# Altium schematic symbol library jlcpcb_2025_04_capacitors_extended_1206.schlib: 2503 symbols (part 8 of 14)
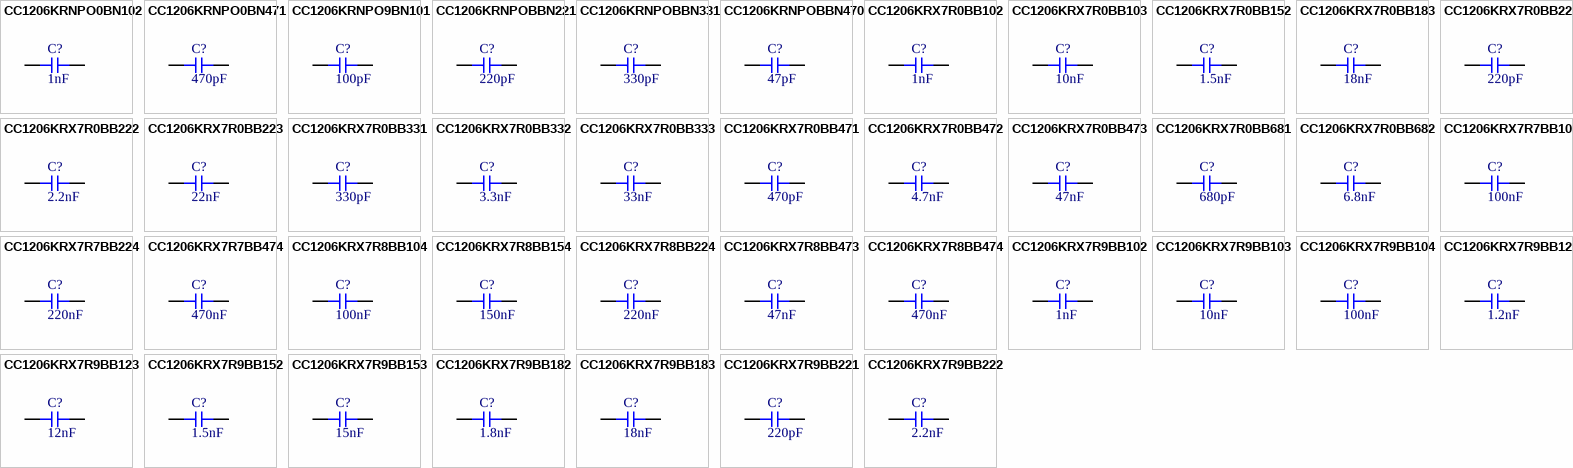
[diagram p69: symbols CC1206KRNPO0BN102 to CC1206KRX7R9BB222]

## CC1206KRNPO9BN101
designator C?  Capacitance: 100pF  (hidden comment: *)
Capacitor, Ceramic (MLCC), 100pF, ±10%, 50V, NP0, ±10%, SMD 1206; Manufacturer: YAGEO; Manufacturer Part Number: CC1206KRNPO9BN101; Package Size: 1206; JLCPCB Basic Part: No; JLCPCB Part Number: C1854299; Supplier 1: LCSC; Category: Capacitors - MLCC; Supplier Part Number 1: C1854299; Tolerance: ±10%; Voltage Rating: 50V; Temperature Coefficient: NP0; RoHS: Yes; ComponentLink1Description: Datasheet; ComponentLink1URL: https://wmsc.lcsc.com/wmsc/upload/file/pdf/v2/lcsc/2201271130_YAGEO-CC1206KRNPO9BN101_C1854299.pdf; ComponentLink2Description: JLCPCB Part URL; ComponentLink2URL: https://jlcpcb.com/partdetail/C1854299; ComponentLink3Description: LCSC Part URL; ComponentLink3URL: https://lcsc.com/product-detail/Multilayer-Ceramic-Capacitors-MLCC---SMD-SMT_YAGEO-YAGEO-CC1206KRNPO9BN101_C1854299.html
footprint CAP-1206 (1206 (3216M) Capacitor)
pins: 1, 2

## CC1206KRNPOBBN221
designator C?  Capacitance: 220pF  (hidden comment: *)
Capacitor, Ceramic (MLCC), 220pF, ±10%, 500V, NP0, ±10%, SMD 1206; Manufacturer: YAGEO; Manufacturer Part Number: CC1206KRNPOBBN221; Package Size: 1206; JLCPCB Basic Part: No; JLCPCB Part Number: C527341; Supplier 1: LCSC; Category: Capacitors - MLCC; Supplier Part Number 1: C527341; Tolerance: ±10%; Voltage Rating: 500V; Temperature Coefficient: NP0; RoHS: Yes; ComponentLink1Description: Datasheet; ComponentLink1URL: https://wmsc.lcsc.com/wmsc/upload/file/pdf/v2/lcsc/2007021837_YAGEO-CC1206KRNPOBBN221_C527341.pdf; ComponentLink2Description: JLCPCB Part URL; ComponentLink2URL: https://jlcpcb.com/partdetail/C527341; ComponentLink3Description: LCSC Part URL; ComponentLink3URL: https://lcsc.com/product-detail/Multilayer-Ceramic-Capacitors-MLCC---SMD-SMT_YAGEO-YAGEO-CC1206KRNPOBBN221_C527341.html
footprint CAP-1206 (1206 (3216M) Capacitor)
pins: 1, 2

## CC1206KRNPOBBN331
designator C?  Capacitance: 330pF  (hidden comment: *)
Capacitor, Ceramic (MLCC), 330pF, ±10%, 500V, NP0, ±10%, SMD 1206; Manufacturer: YAGEO; Manufacturer Part Number: CC1206KRNPOBBN331; Package Size: 1206; JLCPCB Basic Part: No; JLCPCB Part Number: C527342; Supplier 1: LCSC; Category: Capacitors - MLCC; Supplier Part Number 1: C527342; Tolerance: ±10%; Voltage Rating: 500V; Temperature Coefficient: NP0; RoHS: Yes; ComponentLink1Description: Datasheet; ComponentLink1URL: https://wmsc.lcsc.com/wmsc/upload/file/pdf/v2/lcsc/2007091835_YAGEO-CC1206KRNPOBBN331_C527342.pdf; ComponentLink2Description: JLCPCB Part URL; ComponentLink2URL: https://jlcpcb.com/partdetail/C527342; ComponentLink3Description: LCSC Part URL; ComponentLink3URL: https://lcsc.com/product-detail/Multilayer-Ceramic-Capacitors-MLCC---SMD-SMT_YAGEO-YAGEO-CC1206KRNPOBBN331_C527342.html
footprint CAP-1206 (1206 (3216M) Capacitor)
pins: 1, 2

## CC1206KRNPOBBN470
designator C?  Capacitance: 47pF  (hidden comment: *)
Capacitor, Ceramic (MLCC), 47pF, ±10%, 500V, NP0, ±10%, SMD 1206; Manufacturer: YAGEO; Manufacturer Part Number: CC1206KRNPOBBN470; Package Size: 1206; JLCPCB Basic Part: No; JLCPCB Part Number: C527343; Supplier 1: LCSC; Category: Capacitors - MLCC; Supplier Part Number 1: C527343; Tolerance: ±10%; Voltage Rating: 500V; Temperature Coefficient: NP0; RoHS: Yes; ComponentLink1Description: Datasheet; ComponentLink1URL: https://wmsc.lcsc.com/wmsc/upload/file/pdf/v2/lcsc/2006241835_YAGEO-CC1206KRNPOBBN470_C527343.pdf; ComponentLink2Description: JLCPCB Part URL; ComponentLink2URL: https://jlcpcb.com/partdetail/C527343; ComponentLink3Description: LCSC Part URL; ComponentLink3URL: https://lcsc.com/product-detail/Multilayer-Ceramic-Capacitors-MLCC---SMD-SMT_YAGEO-YAGEO-CC1206KRNPOBBN470_C527343.html
footprint CAP-1206 (1206 (3216M) Capacitor)
pins: 1, 2

## CC1206KRX7R0BB102
designator C?  Capacitance: 1nF  (hidden comment: *)
Capacitor, Ceramic (MLCC), 1nF, ±10%, 100V, X7R, ±10%, SMD 1206; Manufacturer: YAGEO; Manufacturer Part Number: CC1206KRX7R0BB102; Package Size: 1206; JLCPCB Basic Part: No; JLCPCB Part Number: C107203; Supplier 1: LCSC; Category: Capacitors - MLCC; Supplier Part Number 1: C107203; Tolerance: ±10%; Voltage Rating: 100V; Temperature Coefficient: X7R; RoHS: Yes; ComponentLink1Description: Datasheet; ComponentLink1URL: https://wmsc.lcsc.com/wmsc/upload/file/pdf/v2/lcsc/2304140030_YAGEO-CC1206KRX7R0BB102_C107203.pdf; ComponentLink2Description: JLCPCB Part URL; ComponentLink2URL: https://jlcpcb.com/partdetail/C107203; ComponentLink3Description: LCSC Part URL; ComponentLink3URL: https://lcsc.com/product-detail/Multilayer-Ceramic-Capacitors-MLCC---SMD-SMT_YAGEO-YAGEO-CC1206KRX7R0BB102_C107203.html
footprint CAP-1206 (1206 (3216M) Capacitor)
pins: 1, 2

## CC1206KRX7R0BB103
designator C?  Capacitance: 10nF  (hidden comment: *)
Capacitor, Ceramic (MLCC), 10nF, ±10%, 100V, X7R, ±10%, SMD 1206; Manufacturer: YAGEO; Manufacturer Part Number: CC1206KRX7R0BB103; Package Size: 1206; JLCPCB Basic Part: No; JLCPCB Part Number: C107204; Supplier 1: LCSC; Category: Capacitors - MLCC; Supplier Part Number 1: C107204; Tolerance: ±10%; Voltage Rating: 100V; Temperature Coefficient: X7R; RoHS: Yes; ComponentLink1Description: Datasheet; ComponentLink1URL: https://wmsc.lcsc.com/wmsc/upload/file/pdf/v2/lcsc/2304140030_YAGEO-CC1206KRX7R0BB103_C107204.pdf; ComponentLink2Description: JLCPCB Part URL; ComponentLink2URL: https://jlcpcb.com/partdetail/C107204; ComponentLink3Description: LCSC Part URL; ComponentLink3URL: https://lcsc.com/product-detail/Multilayer-Ceramic-Capacitors-MLCC---SMD-SMT_YAGEO-YAGEO-CC1206KRX7R0BB103_C107204.html
footprint CAP-1206 (1206 (3216M) Capacitor)
pins: 1, 2

## CC1206KRX7R0BB152
designator C?  Capacitance: 1.5nF  (hidden comment: *)
Capacitor, Ceramic (MLCC), 1.5nF, ±10%, 100V, X7R, ±10%, SMD 1206; Manufacturer: YAGEO; Manufacturer Part Number: CC1206KRX7R0BB152; Package Size: 1206; JLCPCB Basic Part: No; JLCPCB Part Number: C527344; Supplier 1: LCSC; Category: Capacitors - MLCC; Supplier Part Number 1: C527344; Tolerance: ±10%; Voltage Rating: 100V; Temperature Coefficient: X7R; RoHS: Yes; ComponentLink1Description: Datasheet; ComponentLink1URL: https://wmsc.lcsc.com/wmsc/upload/file/pdf/v2/lcsc/2005222143_YAGEO-CC1206KRX7R0BB152_C527344.pdf; ComponentLink2Description: JLCPCB Part URL; ComponentLink2URL: https://jlcpcb.com/partdetail/C527344; ComponentLink3Description: LCSC Part URL; ComponentLink3URL: https://lcsc.com/product-detail/Multilayer-Ceramic-Capacitors-MLCC---SMD-SMT_YAGEO-YAGEO-CC1206KRX7R0BB152_C527344.html
footprint CAP-1206 (1206 (3216M) Capacitor)
pins: 1, 2

## CC1206KRX7R0BB183
designator C?  Capacitance: 18nF  (hidden comment: *)
Capacitor, Ceramic (MLCC), 18nF, ±10%, 100V, X7R, ±10%, SMD 1206; Manufacturer: YAGEO; Manufacturer Part Number: CC1206KRX7R0BB183; Package Size: 1206; JLCPCB Basic Part: No; JLCPCB Part Number: C527345; Supplier 1: LCSC; Category: Capacitors - MLCC; Supplier Part Number 1: C527345; Tolerance: ±10%; Voltage Rating: 100V; Temperature Coefficient: X7R; RoHS: Yes; ComponentLink1Description: Datasheet; ComponentLink1URL: https://wmsc.lcsc.com/wmsc/upload/file/pdf/v2/lcsc/2007221234_YAGEO-CC1206KRX7R0BB183_C527345.pdf; ComponentLink2Description: JLCPCB Part URL; ComponentLink2URL: https://jlcpcb.com/partdetail/C527345; ComponentLink3Description: LCSC Part URL; ComponentLink3URL: https://lcsc.com/product-detail/Multilayer-Ceramic-Capacitors-MLCC---SMD-SMT_YAGEO-YAGEO-CC1206KRX7R0BB183_C527345.html
footprint CAP-1206 (1206 (3216M) Capacitor)
pins: 1, 2

## CC1206KRX7R0BB221
designator C?  Capacitance: 220pF  (hidden comment: *)
Capacitor, Ceramic (MLCC), 220pF, ±10%, 100V, X7R, ±10%, SMD 1206; Manufacturer: YAGEO; Manufacturer Part Number: CC1206KRX7R0BB221; Package Size: 1206; JLCPCB Basic Part: No; JLCPCB Part Number: C577231; Supplier 1: LCSC; Category: Capacitors - MLCC; Supplier Part Number 1: C577231; Tolerance: ±10%; Voltage Rating: 100V; Temperature Coefficient: X7R; RoHS: Yes; ComponentLink1Description: Datasheet; ComponentLink1URL: https://wmsc.lcsc.com/wmsc/upload/file/pdf/v2/lcsc/2201242200_YAGEO-CC1206KRX7R0BB221_C577231.pdf; ComponentLink2Description: JLCPCB Part URL; ComponentLink2URL: https://jlcpcb.com/partdetail/C577231; ComponentLink3Description: LCSC Part URL; ComponentLink3URL: https://lcsc.com/product-detail/Multilayer-Ceramic-Capacitors-MLCC---SMD-SMT_YAGEO-YAGEO-CC1206KRX7R0BB221_C577231.html
footprint CAP-1206 (1206 (3216M) Capacitor)
pins: 1, 2

## CC1206KRX7R0BB222
designator C?  Capacitance: 2.2nF  (hidden comment: *)
Capacitor, Ceramic (MLCC), 2.2nF, ±10%, 100V, X7R, ±10%, SMD 1206; Manufacturer: YAGEO; Manufacturer Part Number: CC1206KRX7R0BB222; Package Size: 1206; JLCPCB Basic Part: No; JLCPCB Part Number: C107205; Supplier 1: LCSC; Category: Capacitors - MLCC; Supplier Part Number 1: C107205; Tolerance: ±10%; Voltage Rating: 100V; Temperature Coefficient: X7R; RoHS: Yes; ComponentLink1Description: Datasheet; ComponentLink1URL: https://wmsc.lcsc.com/wmsc/upload/file/pdf/v2/lcsc/2304140030_YAGEO-CC1206KRX7R0BB222_C107205.pdf; ComponentLink2Description: JLCPCB Part URL; ComponentLink2URL: https://jlcpcb.com/partdetail/C107205; ComponentLink3Description: LCSC Part URL; ComponentLink3URL: https://lcsc.com/product-detail/Multilayer-Ceramic-Capacitors-MLCC---SMD-SMT_YAGEO-YAGEO-CC1206KRX7R0BB222_C107205.html
footprint CAP-1206 (1206 (3216M) Capacitor)
pins: 1, 2

## CC1206KRX7R0BB223
designator C?  Capacitance: 22nF  (hidden comment: *)
Capacitor, Ceramic (MLCC), 22nF, ±10%, 100V, X7R, ±10%, SMD 1206; Manufacturer: YAGEO; Manufacturer Part Number: CC1206KRX7R0BB223; Package Size: 1206; JLCPCB Basic Part: No; JLCPCB Part Number: C513671; Supplier 1: LCSC; Category: Capacitors - MLCC; Supplier Part Number 1: C513671; Tolerance: ±10%; Voltage Rating: 100V; Temperature Coefficient: X7R; RoHS: Yes; ComponentLink1Description: Datasheet; ComponentLink1URL: https://wmsc.lcsc.com/wmsc/upload/file/pdf/v2/lcsc/2005142208_YAGEO-CC1206KRX7R0BB223_C513671.pdf; ComponentLink2Description: JLCPCB Part URL; ComponentLink2URL: https://jlcpcb.com/partdetail/C513671; ComponentLink3Description: LCSC Part URL; ComponentLink3URL: https://lcsc.com/product-detail/Multilayer-Ceramic-Capacitors-MLCC---SMD-SMT_YAGEO-YAGEO-CC1206KRX7R0BB223_C513671.html
footprint CAP-1206 (1206 (3216M) Capacitor)
pins: 1, 2

## CC1206KRX7R0BB331
designator C?  Capacitance: 330pF  (hidden comment: *)
Capacitor, Ceramic (MLCC), 330pF, ±10%, 100V, X7R, ±10%, SMD 1206; Manufacturer: YAGEO; Manufacturer Part Number: CC1206KRX7R0BB331; Package Size: 1206; JLCPCB Basic Part: No; JLCPCB Part Number: C513609; Supplier 1: LCSC; Category: Capacitors - MLCC; Supplier Part Number 1: C513609; Tolerance: ±10%; Voltage Rating: 100V; Temperature Coefficient: X7R; RoHS: Yes; ComponentLink1Description: Datasheet; ComponentLink1URL: https://wmsc.lcsc.com/wmsc/upload/file/pdf/v2/lcsc/2005142148_YAGEO-CC1206KRX7R0BB331_C513609.pdf; ComponentLink2Description: JLCPCB Part URL; ComponentLink2URL: https://jlcpcb.com/partdetail/C513609; ComponentLink3Description: LCSC Part URL; ComponentLink3URL: https://lcsc.com/product-detail/Multilayer-Ceramic-Capacitors-MLCC---SMD-SMT_YAGEO-YAGEO-CC1206KRX7R0BB331_C513609.html
footprint CAP-1206 (1206 (3216M) Capacitor)
pins: 1, 2

## CC1206KRX7R0BB332
designator C?  Capacitance: 3.3nF  (hidden comment: *)
Capacitor, Ceramic (MLCC), 3.3nF, ±10%, 100V, X7R, ±10%, SMD 1206; Manufacturer: YAGEO; Manufacturer Part Number: CC1206KRX7R0BB332; Package Size: 1206; JLCPCB Basic Part: No; JLCPCB Part Number: C577233; Supplier 1: LCSC; Category: Capacitors - MLCC; Supplier Part Number 1: C577233; Tolerance: ±10%; Voltage Rating: 100V; Temperature Coefficient: X7R; RoHS: Yes; ComponentLink1Description: Datasheet; ComponentLink1URL: https://wmsc.lcsc.com/wmsc/upload/file/pdf/v2/lcsc/2201242200_YAGEO-CC1206KRX7R0BB332_C577233.pdf; ComponentLink2Description: JLCPCB Part URL; ComponentLink2URL: https://jlcpcb.com/partdetail/C577233; ComponentLink3Description: LCSC Part URL; ComponentLink3URL: https://lcsc.com/product-detail/Multilayer-Ceramic-Capacitors-MLCC---SMD-SMT_YAGEO-YAGEO-CC1206KRX7R0BB332_C577233.html
footprint CAP-1206 (1206 (3216M) Capacitor)
pins: 1, 2

## CC1206KRX7R0BB333
designator C?  Capacitance: 33nF  (hidden comment: *)
Capacitor, Ceramic (MLCC), 33nF, ±10%, 100V, X7R, ±10%, SMD 1206; Manufacturer: YAGEO; Manufacturer Part Number: CC1206KRX7R0BB333; Package Size: 1206; JLCPCB Basic Part: No; JLCPCB Part Number: C113901; Supplier 1: LCSC; Category: Capacitors - MLCC; Supplier Part Number 1: C113901; Tolerance: ±10%; Voltage Rating: 100V; Temperature Coefficient: X7R; RoHS: Yes; ComponentLink1Description: Datasheet; ComponentLink1URL: https://wmsc.lcsc.com/wmsc/upload/file/pdf/v2/lcsc/2304140030_YAGEO-CC1206KRX7R0BB333_C113901.pdf; ComponentLink2Description: JLCPCB Part URL; ComponentLink2URL: https://jlcpcb.com/partdetail/C113901; ComponentLink3Description: LCSC Part URL; ComponentLink3URL: https://lcsc.com/product-detail/Multilayer-Ceramic-Capacitors-MLCC---SMD-SMT_YAGEO-YAGEO-CC1206KRX7R0BB333_C113901.html
footprint CAP-1206 (1206 (3216M) Capacitor)
pins: 1, 2

## CC1206KRX7R0BB471
designator C?  Capacitance: 470pF  (hidden comment: *)
Capacitor, Ceramic (MLCC), 470pF, ±10%, 100V, X7R, ±10%, SMD 1206; Manufacturer: YAGEO; Manufacturer Part Number: CC1206KRX7R0BB471; Package Size: 1206; JLCPCB Basic Part: No; JLCPCB Part Number: C326698; Supplier 1: LCSC; Category: Capacitors - MLCC; Supplier Part Number 1: C326698; Tolerance: ±10%; Voltage Rating: 100V; Temperature Coefficient: X7R; RoHS: Yes; ComponentLink1Description: Datasheet; ComponentLink1URL: https://wmsc.lcsc.com/wmsc/upload/file/pdf/v2/lcsc/1811151646_YAGEO-CC1206KRX7R0BB471_C326698.pdf; ComponentLink2Description: JLCPCB Part URL; ComponentLink2URL: https://jlcpcb.com/partdetail/C326698; ComponentLink3Description: LCSC Part URL; ComponentLink3URL: https://lcsc.com/product-detail/Multilayer-Ceramic-Capacitors-MLCC---SMD-SMT_YAGEO-YAGEO-CC1206KRX7R0BB471_C326698.html
footprint CAP-1206 (1206 (3216M) Capacitor)
pins: 1, 2

## CC1206KRX7R0BB472
designator C?  Capacitance: 4.7nF  (hidden comment: *)
Capacitor, Ceramic (MLCC), 4.7nF, ±10%, 100V, X7R, ±10%, SMD 1206; Manufacturer: YAGEO; Manufacturer Part Number: CC1206KRX7R0BB472; Package Size: 1206; JLCPCB Basic Part: No; JLCPCB Part Number: C577234; Supplier 1: LCSC; Category: Capacitors - MLCC; Supplier Part Number 1: C577234; Tolerance: ±10%; Voltage Rating: 100V; Temperature Coefficient: X7R; RoHS: Yes; ComponentLink1Description: Datasheet; ComponentLink1URL: https://wmsc.lcsc.com/wmsc/upload/file/pdf/v2/lcsc/2304140030_YAGEO-CC1206KRX7R0BB472_C577234.pdf; ComponentLink2Description: JLCPCB Part URL; ComponentLink2URL: https://jlcpcb.com/partdetail/C577234; ComponentLink3Description: LCSC Part URL; ComponentLink3URL: https://lcsc.com/product-detail/Multilayer-Ceramic-Capacitors-MLCC---SMD-SMT_YAGEO-YAGEO-CC1206KRX7R0BB472_C577234.html
footprint CAP-1206 (1206 (3216M) Capacitor)
pins: 1, 2

## CC1206KRX7R0BB473
designator C?  Capacitance: 47nF  (hidden comment: *)
Capacitor, Ceramic (MLCC), 47nF, ±10%, 100V, X7R, ±10%, SMD 1206; Manufacturer: YAGEO; Manufacturer Part Number: CC1206KRX7R0BB473; Package Size: 1206; JLCPCB Basic Part: No; JLCPCB Part Number: C107206; Supplier 1: LCSC; Category: Capacitors - MLCC; Supplier Part Number 1: C107206; Tolerance: ±10%; Voltage Rating: 100V; Temperature Coefficient: X7R; RoHS: Yes; ComponentLink1Description: Datasheet; ComponentLink1URL: https://wmsc.lcsc.com/wmsc/upload/file/pdf/v2/lcsc/2304140030_YAGEO-CC1206KRX7R0BB473_C107206.pdf; ComponentLink2Description: JLCPCB Part URL; ComponentLink2URL: https://jlcpcb.com/partdetail/C107206; ComponentLink3Description: LCSC Part URL; ComponentLink3URL: https://lcsc.com/product-detail/Multilayer-Ceramic-Capacitors-MLCC---SMD-SMT_YAGEO-YAGEO-CC1206KRX7R0BB473_C107206.html
footprint CAP-1206 (1206 (3216M) Capacitor)
pins: 1, 2

## CC1206KRX7R0BB681
designator C?  Capacitance: 680pF  (hidden comment: *)
Capacitor, Ceramic (MLCC), 680pF, ±10%, 100V, X7R, ±10%, SMD 1206; Manufacturer: YAGEO; Manufacturer Part Number: CC1206KRX7R0BB681; Package Size: 1206; JLCPCB Basic Part: No; JLCPCB Part Number: C327055; Supplier 1: LCSC; Category: Capacitors - MLCC; Supplier Part Number 1: C327055; Tolerance: ±10%; Voltage Rating: 100V; Temperature Coefficient: X7R; RoHS: Yes; ComponentLink1Description: Datasheet; ComponentLink1URL: https://wmsc.lcsc.com/wmsc/upload/file/pdf/v2/lcsc/1811141226_YAGEO-CC1206KRX7R0BB681_C327055.pdf; ComponentLink2Description: JLCPCB Part URL; ComponentLink2URL: https://jlcpcb.com/partdetail/C327055; ComponentLink3Description: LCSC Part URL; ComponentLink3URL: https://lcsc.com/product-detail/Multilayer-Ceramic-Capacitors-MLCC---SMD-SMT_YAGEO-YAGEO-CC1206KRX7R0BB681_C327055.html
footprint CAP-1206 (1206 (3216M) Capacitor)
pins: 1, 2

## CC1206KRX7R0BB682
designator C?  Capacitance: 6.8nF  (hidden comment: *)
Capacitor, Ceramic (MLCC), 6.8nF, ±10%, 100V, X7R, ±10%, SMD 1206; Manufacturer: YAGEO; Manufacturer Part Number: CC1206KRX7R0BB682; Package Size: 1206; JLCPCB Basic Part: No; JLCPCB Part Number: C577236; Supplier 1: LCSC; Category: Capacitors - MLCC; Supplier Part Number 1: C577236; Tolerance: ±10%; Voltage Rating: 100V; Temperature Coefficient: X7R; RoHS: Yes; ComponentLink1Description: Datasheet; ComponentLink1URL: https://wmsc.lcsc.com/wmsc/upload/file/pdf/v2/lcsc/2304140030_YAGEO-CC1206KRX7R0BB682_C577236.pdf; ComponentLink2Description: JLCPCB Part URL; ComponentLink2URL: https://jlcpcb.com/partdetail/C577236; ComponentLink3Description: LCSC Part URL; ComponentLink3URL: https://lcsc.com/product-detail/Multilayer-Ceramic-Capacitors-MLCC---SMD-SMT_YAGEO-YAGEO-CC1206KRX7R0BB682_C577236.html
footprint CAP-1206 (1206 (3216M) Capacitor)
pins: 1, 2

## CC1206KRX7R7BB104
designator C?  Capacitance: 100nF  (hidden comment: *)
Capacitor, Ceramic (MLCC), 100nF, ±10%, 16V, X7R, ±10%, SMD 1206; Manufacturer: YAGEO; Manufacturer Part Number: CC1206KRX7R7BB104; Package Size: 1206; JLCPCB Basic Part: No; JLCPCB Part Number: C2180991; Supplier 1: LCSC; Category: Capacitors - MLCC; Supplier Part Number 1: C2180991; Tolerance: ±10%; Voltage Rating: 16V; Temperature Coefficient: X7R; RoHS: Yes; ComponentLink1Description: Datasheet; ComponentLink1URL: https://wmsc.lcsc.com/wmsc/upload/file/pdf/v2/lcsc/2202041200_YAGEO-CC1206KRX7R7BB104_C2180991.pdf; ComponentLink2Description: JLCPCB Part URL; ComponentLink2URL: https://jlcpcb.com/partdetail/C2180991; ComponentLink3Description: LCSC Part URL; ComponentLink3URL: https://lcsc.com/product-detail/Multilayer-Ceramic-Capacitors-MLCC---SMD-SMT_YAGEO-YAGEO-CC1206KRX7R7BB104_C2180991.html
footprint CAP-1206 (1206 (3216M) Capacitor)
pins: 1, 2

## CC1206KRX7R7BB224
designator C?  Capacitance: 220nF  (hidden comment: *)
Capacitor, Ceramic (MLCC), 220nF, ±10%, 16V, X7R, ±10%, SMD 1206; Manufacturer: YAGEO; Manufacturer Part Number: CC1206KRX7R7BB224; Package Size: 1206; JLCPCB Basic Part: No; JLCPCB Part Number: C113903; Supplier 1: LCSC; Category: Capacitors - MLCC; Supplier Part Number 1: C113903; Tolerance: ±10%; Voltage Rating: 16V; Temperature Coefficient: X7R; RoHS: Yes; ComponentLink1Description: Datasheet; ComponentLink1URL: https://wmsc.lcsc.com/wmsc/upload/file/pdf/v2/lcsc/2304140030_YAGEO-CC1206KRX7R7BB224_C113903.pdf; ComponentLink2Description: JLCPCB Part URL; ComponentLink2URL: https://jlcpcb.com/partdetail/C113903; ComponentLink3Description: LCSC Part URL; ComponentLink3URL: https://lcsc.com/product-detail/Multilayer-Ceramic-Capacitors-MLCC---SMD-SMT_YAGEO-YAGEO-CC1206KRX7R7BB224_C113903.html
footprint CAP-1206 (1206 (3216M) Capacitor)
pins: 1, 2

## CC1206KRX7R7BB474
designator C?  Capacitance: 470nF  (hidden comment: *)
Capacitor, Ceramic (MLCC), 470nF, ±10%, 16V, X7R, ±10%, SMD 1206; Manufacturer: YAGEO; Manufacturer Part Number: CC1206KRX7R7BB474; Package Size: 1206; JLCPCB Basic Part: No; JLCPCB Part Number: C527346; Supplier 1: LCSC; Category: Capacitors - MLCC; Supplier Part Number 1: C527346; Tolerance: ±10%; Voltage Rating: 16V; Temperature Coefficient: X7R; RoHS: Yes; ComponentLink1Description: Datasheet; ComponentLink1URL: https://wmsc.lcsc.com/wmsc/upload/file/pdf/v2/lcsc/2006031836_YAGEO-CC1206KRX7R7BB474_C527346.pdf; ComponentLink2Description: JLCPCB Part URL; ComponentLink2URL: https://jlcpcb.com/partdetail/C527346; ComponentLink3Description: LCSC Part URL; ComponentLink3URL: https://lcsc.com/product-detail/Multilayer-Ceramic-Capacitors-MLCC---SMD-SMT_YAGEO-YAGEO-CC1206KRX7R7BB474_C527346.html
footprint CAP-1206 (1206 (3216M) Capacitor)
pins: 1, 2

## CC1206KRX7R8BB104
designator C?  Capacitance: 100nF  (hidden comment: *)
Capacitor, Ceramic (MLCC), 100nF, ±10%, 25V, X7R, ±10%, SMD 1206; Manufacturer: YAGEO; Manufacturer Part Number: CC1206KRX7R8BB104; Package Size: 1206; JLCPCB Basic Part: No; JLCPCB Part Number: C527347; Supplier 1: LCSC; Category: Capacitors - MLCC; Supplier Part Number 1: C527347; Tolerance: ±10%; Voltage Rating: 25V; Temperature Coefficient: X7R; RoHS: Yes; ComponentLink1Description: Datasheet; ComponentLink1URL: https://wmsc.lcsc.com/wmsc/upload/file/pdf/v2/lcsc/2005261833_YAGEO-CC1206KRX7R8BB104_C527347.pdf; ComponentLink2Description: JLCPCB Part URL; ComponentLink2URL: https://jlcpcb.com/partdetail/C527347; ComponentLink3Description: LCSC Part URL; ComponentLink3URL: https://lcsc.com/product-detail/Multilayer-Ceramic-Capacitors-MLCC---SMD-SMT_YAGEO-YAGEO-CC1206KRX7R8BB104_C527347.html
footprint CAP-1206 (1206 (3216M) Capacitor)
pins: 1, 2

## CC1206KRX7R8BB154
designator C?  Capacitance: 150nF  (hidden comment: *)
Capacitor, Ceramic (MLCC), 150nF, ±10%, 25V, X7R, ±10%, SMD 1206; Manufacturer: YAGEO; Manufacturer Part Number: CC1206KRX7R8BB154; Package Size: 1206; JLCPCB Basic Part: No; JLCPCB Part Number: C577239; Supplier 1: LCSC; Category: Capacitors - MLCC; Supplier Part Number 1: C577239; Tolerance: ±10%; Voltage Rating: 25V; Temperature Coefficient: X7R; RoHS: Yes; ComponentLink1Description: Datasheet; ComponentLink1URL: https://wmsc.lcsc.com/wmsc/upload/file/pdf/v2/lcsc/2311211121_YAGEO-CC1206KRX7R8BB154_C577239.pdf; ComponentLink2Description: JLCPCB Part URL; ComponentLink2URL: https://jlcpcb.com/partdetail/C577239; ComponentLink3Description: LCSC Part URL; ComponentLink3URL: https://lcsc.com/product-detail/Multilayer-Ceramic-Capacitors-MLCC---SMD-SMT_YAGEO-YAGEO-CC1206KRX7R8BB154_C577239.html
footprint CAP-1206 (1206 (3216M) Capacitor)
pins: 1, 2

## CC1206KRX7R8BB224
designator C?  Capacitance: 220nF  (hidden comment: *)
Capacitor, Ceramic (MLCC), 220nF, ±10%, 25V, X7R, ±10%, SMD 1206; Manufacturer: YAGEO; Manufacturer Part Number: CC1206KRX7R8BB224; Package Size: 1206; JLCPCB Basic Part: No; JLCPCB Part Number: C527348; Supplier 1: LCSC; Category: Capacitors - MLCC; Supplier Part Number 1: C527348; Tolerance: ±10%; Voltage Rating: 25V; Temperature Coefficient: X7R; RoHS: Yes; ComponentLink1Description: Datasheet; ComponentLink1URL: https://wmsc.lcsc.com/wmsc/upload/file/pdf/v2/lcsc/2005222143_YAGEO-CC1206KRX7R8BB224_C527348.pdf; ComponentLink2Description: JLCPCB Part URL; ComponentLink2URL: https://jlcpcb.com/partdetail/C527348; ComponentLink3Description: LCSC Part URL; ComponentLink3URL: https://lcsc.com/product-detail/Multilayer-Ceramic-Capacitors-MLCC---SMD-SMT_YAGEO-YAGEO-CC1206KRX7R8BB224_C527348.html
footprint CAP-1206 (1206 (3216M) Capacitor)
pins: 1, 2

## CC1206KRX7R8BB473
designator C?  Capacitance: 47nF  (hidden comment: *)
Capacitor, Ceramic (MLCC), 47nF, ±10%, 25V, X7R, ±10%, SMD 1206; Manufacturer: YAGEO; Manufacturer Part Number: CC1206KRX7R8BB473; Package Size: 1206; JLCPCB Basic Part: No; JLCPCB Part Number: C527349; Supplier 1: LCSC; Category: Capacitors - MLCC; Supplier Part Number 1: C527349; Tolerance: ±10%; Voltage Rating: 25V; Temperature Coefficient: X7R; RoHS: Yes; ComponentLink1Description: Datasheet; ComponentLink1URL: https://wmsc.lcsc.com/wmsc/upload/file/pdf/v2/lcsc/2006101835_YAGEO-CC1206KRX7R8BB473_C527349.pdf; ComponentLink2Description: JLCPCB Part URL; ComponentLink2URL: https://jlcpcb.com/partdetail/C527349; ComponentLink3Description: LCSC Part URL; ComponentLink3URL: https://lcsc.com/product-detail/Multilayer-Ceramic-Capacitors-MLCC---SMD-SMT_YAGEO-YAGEO-CC1206KRX7R8BB473_C527349.html
footprint CAP-1206 (1206 (3216M) Capacitor)
pins: 1, 2

## CC1206KRX7R8BB474
designator C?  Capacitance: 470nF  (hidden comment: *)
Capacitor, Ceramic (MLCC), 470nF, ±10%, 25V, X7R, ±10%, SMD 1206; Manufacturer: YAGEO; Manufacturer Part Number: CC1206KRX7R8BB474; Package Size: 1206; JLCPCB Basic Part: No; JLCPCB Part Number: C527350; Supplier 1: LCSC; Category: Capacitors - MLCC; Supplier Part Number 1: C527350; Tolerance: ±10%; Voltage Rating: 25V; Temperature Coefficient: X7R; RoHS: Yes; ComponentLink1Description: Datasheet; ComponentLink1URL: https://wmsc.lcsc.com/wmsc/upload/file/pdf/v2/lcsc/2006031836_YAGEO-CC1206KRX7R8BB474_C527350.pdf; ComponentLink2Description: JLCPCB Part URL; ComponentLink2URL: https://jlcpcb.com/partdetail/C527350; ComponentLink3Description: LCSC Part URL; ComponentLink3URL: https://lcsc.com/product-detail/Multilayer-Ceramic-Capacitors-MLCC---SMD-SMT_YAGEO-YAGEO-CC1206KRX7R8BB474_C527350.html
footprint CAP-1206 (1206 (3216M) Capacitor)
pins: 1, 2

## CC1206KRX7R9BB102
designator C?  Capacitance: 1nF  (hidden comment: *)
Capacitor, Ceramic (MLCC), 1nF, ±10%, 50V, X7R, ±10%, SMD 1206; Manufacturer: YAGEO; Manufacturer Part Number: CC1206KRX7R9BB102; Package Size: 1206; JLCPCB Basic Part: No; JLCPCB Part Number: C107207; Supplier 1: LCSC; Category: Capacitors - MLCC; Supplier Part Number 1: C107207; Tolerance: ±10%; Voltage Rating: 50V; Temperature Coefficient: X7R; RoHS: Yes; ComponentLink1Description: Datasheet; ComponentLink1URL: https://wmsc.lcsc.com/wmsc/upload/file/pdf/v2/lcsc/2304140030_YAGEO-CC1206KRX7R9BB102_C107207.pdf; ComponentLink2Description: JLCPCB Part URL; ComponentLink2URL: https://jlcpcb.com/partdetail/C107207; ComponentLink3Description: LCSC Part URL; ComponentLink3URL: https://lcsc.com/product-detail/Multilayer-Ceramic-Capacitors-MLCC---SMD-SMT_YAGEO-YAGEO-CC1206KRX7R9BB102_C107207.html
footprint CAP-1206 (1206 (3216M) Capacitor)
pins: 1, 2

## CC1206KRX7R9BB103
designator C?  Capacitance: 10nF  (hidden comment: *)
Capacitor, Ceramic (MLCC), 10nF, ±10%, 50V, X7R, ±10%, SMD 1206; Manufacturer: YAGEO; Manufacturer Part Number: CC1206KRX7R9BB103; Package Size: 1206; JLCPCB Basic Part: No; JLCPCB Part Number: C106239; Supplier 1: LCSC; Category: Capacitors - MLCC; Supplier Part Number 1: C106239; Tolerance: ±10%; Voltage Rating: 50V; Temperature Coefficient: X7R; RoHS: Yes; ComponentLink1Description: Datasheet; ComponentLink1URL: https://wmsc.lcsc.com/wmsc/upload/file/pdf/v2/lcsc/2304140030_YAGEO-CC1206KRX7R9BB103_C106239.pdf; ComponentLink2Description: JLCPCB Part URL; ComponentLink2URL: https://jlcpcb.com/partdetail/C106239; ComponentLink3Description: LCSC Part URL; ComponentLink3URL: https://lcsc.com/product-detail/Multilayer-Ceramic-Capacitors-MLCC---SMD-SMT_YAGEO-YAGEO-CC1206KRX7R9BB103_C106239.html
footprint CAP-1206 (1206 (3216M) Capacitor)
pins: 1, 2

## CC1206KRX7R9BB104
designator C?  Capacitance: 100nF  (hidden comment: *)
Capacitor, Ceramic (MLCC), 100nF, ±10%, 50V, X7R, ±10%, SMD 1206; Manufacturer: YAGEO; Manufacturer Part Number: CC1206KRX7R9BB104; Package Size: 1206; JLCPCB Basic Part: No; JLCPCB Part Number: C82601; Supplier 1: LCSC; Category: Capacitors - MLCC; Supplier Part Number 1: C82601; Tolerance: ±10%; Voltage Rating: 50V; Temperature Coefficient: X7R; RoHS: Yes; ComponentLink1Description: Datasheet; ComponentLink1URL: https://wmsc.lcsc.com/wmsc/upload/file/pdf/v2/lcsc/2304140030_YAGEO-CC1206KRX7R9BB104_C82601.pdf; ComponentLink2Description: JLCPCB Part URL; ComponentLink2URL: https://jlcpcb.com/partdetail/C82601; ComponentLink3Description: LCSC Part URL; ComponentLink3URL: https://lcsc.com/product-detail/Multilayer-Ceramic-Capacitors-MLCC---SMD-SMT_YAGEO-YAGEO-CC1206KRX7R9BB104_C82601.html
footprint CAP-1206 (1206 (3216M) Capacitor)
pins: 1, 2

## CC1206KRX7R9BB122
designator C?  Capacitance: 1.2nF  (hidden comment: *)
Capacitor, Ceramic (MLCC), 1.2nF, ±10%, 50V, X7R, ±10%, SMD 1206; Manufacturer: YAGEO; Manufacturer Part Number: CC1206KRX7R9BB122; Package Size: 1206; JLCPCB Basic Part: No; JLCPCB Part Number: C327095; Supplier 1: LCSC; Category: Capacitors - MLCC; Supplier Part Number 1: C327095; Tolerance: ±10%; Voltage Rating: 50V; Temperature Coefficient: X7R; RoHS: Yes; ComponentLink1Description: Datasheet; ComponentLink1URL: https://wmsc.lcsc.com/wmsc/upload/file/pdf/v2/lcsc/1811141233_YAGEO-CC1206KRX7R9BB122_C327095.pdf; ComponentLink2Description: JLCPCB Part URL; ComponentLink2URL: https://jlcpcb.com/partdetail/C327095; ComponentLink3Description: LCSC Part URL; ComponentLink3URL: https://lcsc.com/product-detail/Multilayer-Ceramic-Capacitors-MLCC---SMD-SMT_YAGEO-YAGEO-CC1206KRX7R9BB122_C327095.html
footprint CAP-1206 (1206 (3216M) Capacitor)
pins: 1, 2

## CC1206KRX7R9BB123
designator C?  Capacitance: 12nF  (hidden comment: *)
Capacitor, Ceramic (MLCC), 12nF, ±10%, 50V, X7R, ±10%, SMD 1206; Manufacturer: YAGEO; Manufacturer Part Number: CC1206KRX7R9BB123; Package Size: 1206; JLCPCB Basic Part: No; JLCPCB Part Number: C541488; Supplier 1: LCSC; Category: Capacitors - MLCC; Supplier Part Number 1: C541488; Tolerance: ±10%; Voltage Rating: 50V; Temperature Coefficient: X7R; RoHS: Yes; ComponentLink1Description: Datasheet; ComponentLink1URL: https://wmsc.lcsc.com/wmsc/upload/file/pdf/v2/lcsc/2006151140_YAGEO-CC1206KRX7R9BB123_C541488.pdf; ComponentLink2Description: JLCPCB Part URL; ComponentLink2URL: https://jlcpcb.com/partdetail/C541488; ComponentLink3Description: LCSC Part URL; ComponentLink3URL: https://lcsc.com/product-detail/Multilayer-Ceramic-Capacitors-MLCC---SMD-SMT_YAGEO-YAGEO-CC1206KRX7R9BB123_C541488.html
footprint CAP-1206 (1206 (3216M) Capacitor)
pins: 1, 2

## CC1206KRX7R9BB152
designator C?  Capacitance: 1.5nF  (hidden comment: *)
Capacitor, Ceramic (MLCC), 1.5nF, ±10%, 50V, X7R, ±10%, SMD 1206; Manufacturer: YAGEO; Manufacturer Part Number: CC1206KRX7R9BB152; Package Size: 1206; JLCPCB Basic Part: No; JLCPCB Part Number: C113904; Supplier 1: LCSC; Category: Capacitors - MLCC; Supplier Part Number 1: C113904; Tolerance: ±10%; Voltage Rating: 50V; Temperature Coefficient: X7R; RoHS: Yes; ComponentLink1Description: Datasheet; ComponentLink1URL: https://wmsc.lcsc.com/wmsc/upload/file/pdf/v2/lcsc/2304140030_YAGEO-CC1206KRX7R9BB152_C113904.pdf; ComponentLink2Description: JLCPCB Part URL; ComponentLink2URL: https://jlcpcb.com/partdetail/C113904; ComponentLink3Description: LCSC Part URL; ComponentLink3URL: https://lcsc.com/product-detail/Multilayer-Ceramic-Capacitors-MLCC---SMD-SMT_YAGEO-YAGEO-CC1206KRX7R9BB152_C113904.html
footprint CAP-1206 (1206 (3216M) Capacitor)
pins: 1, 2

## CC1206KRX7R9BB153
designator C?  Capacitance: 15nF  (hidden comment: *)
Capacitor, Ceramic (MLCC), 15nF, ±10%, 50V, X7R, ±10%, SMD 1206; Manufacturer: YAGEO; Manufacturer Part Number: CC1206KRX7R9BB153; Package Size: 1206; JLCPCB Basic Part: No; JLCPCB Part Number: C309503; Supplier 1: LCSC; Category: Capacitors - MLCC; Supplier Part Number 1: C309503; Tolerance: ±10%; Voltage Rating: 50V; Temperature Coefficient: X7R; RoHS: Yes; ComponentLink1Description: Datasheet; ComponentLink1URL: https://wmsc.lcsc.com/wmsc/upload/file/pdf/v2/lcsc/2304140030_YAGEO-CC1206KRX7R9BB153_C309503.pdf; ComponentLink2Description: JLCPCB Part URL; ComponentLink2URL: https://jlcpcb.com/partdetail/C309503; ComponentLink3Description: LCSC Part URL; ComponentLink3URL: https://lcsc.com/product-detail/Multilayer-Ceramic-Capacitors-MLCC---SMD-SMT_YAGEO-YAGEO-CC1206KRX7R9BB153_C309503.html
footprint CAP-1206 (1206 (3216M) Capacitor)
pins: 1, 2

## CC1206KRX7R9BB182
designator C?  Capacitance: 1.8nF  (hidden comment: *)
Capacitor, Ceramic (MLCC), 1.8nF, ±10%, 50V, X7R, ±10%, SMD 1206; Manufacturer: YAGEO; Manufacturer Part Number: CC1206KRX7R9BB182; Package Size: 1206; JLCPCB Basic Part: No; JLCPCB Part Number: C527351; Supplier 1: LCSC; Category: Capacitors - MLCC; Supplier Part Number 1: C527351; Tolerance: ±10%; Voltage Rating: 50V; Temperature Coefficient: X7R; RoHS: Yes; ComponentLink1Description: Datasheet; ComponentLink1URL: https://wmsc.lcsc.com/wmsc/upload/file/pdf/v2/lcsc/2006101835_YAGEO-CC1206KRX7R9BB182_C527351.pdf; ComponentLink2Description: JLCPCB Part URL; ComponentLink2URL: https://jlcpcb.com/partdetail/C527351; ComponentLink3Description: LCSC Part URL; ComponentLink3URL: https://lcsc.com/product-detail/Multilayer-Ceramic-Capacitors-MLCC---SMD-SMT_YAGEO-YAGEO-CC1206KRX7R9BB182_C527351.html
footprint CAP-1206 (1206 (3216M) Capacitor)
pins: 1, 2

## CC1206KRX7R9BB183
designator C?  Capacitance: 18nF  (hidden comment: *)
Capacitor, Ceramic (MLCC), 18nF, ±10%, 50V, X7R, ±10%, SMD 1206; Manufacturer: YAGEO; Manufacturer Part Number: CC1206KRX7R9BB183; Package Size: 1206; JLCPCB Basic Part: No; JLCPCB Part Number: C527352; Supplier 1: LCSC; Category: Capacitors - MLCC; Supplier Part Number 1: C527352; Tolerance: ±10%; Voltage Rating: 50V; Temperature Coefficient: X7R; RoHS: Yes; ComponentLink1Description: Datasheet; ComponentLink1URL: https://wmsc.lcsc.com/wmsc/upload/file/pdf/v2/lcsc/2005222143_YAGEO-CC1206KRX7R9BB183_C527352.pdf; ComponentLink2Description: JLCPCB Part URL; ComponentLink2URL: https://jlcpcb.com/partdetail/C527352; ComponentLink3Description: LCSC Part URL; ComponentLink3URL: https://lcsc.com/product-detail/Multilayer-Ceramic-Capacitors-MLCC---SMD-SMT_YAGEO-YAGEO-CC1206KRX7R9BB183_C527352.html
footprint CAP-1206 (1206 (3216M) Capacitor)
pins: 1, 2

## CC1206KRX7R9BB221
designator C?  Capacitance: 220pF  (hidden comment: *)
Capacitor, Ceramic (MLCC), 220pF, ±10%, 50V, X7R, ±10%, SMD 1206; Manufacturer: YAGEO; Manufacturer Part Number: CC1206KRX7R9BB221; Package Size: 1206; JLCPCB Basic Part: No; JLCPCB Part Number: C113905; Supplier 1: LCSC; Category: Capacitors - MLCC; Supplier Part Number 1: C113905; Tolerance: ±10%; Voltage Rating: 50V; Temperature Coefficient: X7R; RoHS: Yes; ComponentLink1Description: Datasheet; ComponentLink1URL: https://wmsc.lcsc.com/wmsc/upload/file/pdf/v2/lcsc/2304140030_YAGEO-CC1206KRX7R9BB221_C113905.pdf; ComponentLink2Description: JLCPCB Part URL; ComponentLink2URL: https://jlcpcb.com/partdetail/C113905; ComponentLink3Description: LCSC Part URL; ComponentLink3URL: https://lcsc.com/product-detail/Multilayer-Ceramic-Capacitors-MLCC---SMD-SMT_YAGEO-YAGEO-CC1206KRX7R9BB221_C113905.html
footprint CAP-1206 (1206 (3216M) Capacitor)
pins: 1, 2

## CC1206KRX7R9BB222
designator C?  Capacitance: 2.2nF  (hidden comment: *)
Capacitor, Ceramic (MLCC), 2.2nF, ±10%, 50V, X7R, ±10%, SMD 1206; Manufacturer: YAGEO; Manufacturer Part Number: CC1206KRX7R9BB222; Package Size: 1206; JLCPCB Basic Part: No; JLCPCB Part Number: C113906; Supplier 1: LCSC; Category: Capacitors - MLCC; Supplier Part Number 1: C113906; Tolerance: ±10%; Voltage Rating: 50V; Temperature Coefficient: X7R; RoHS: Yes; ComponentLink1Description: Datasheet; ComponentLink1URL: https://wmsc.lcsc.com/wmsc/upload/file/pdf/v2/lcsc/2304140030_YAGEO-CC1206KRX7R9BB222_C113906.pdf; ComponentLink2Description: JLCPCB Part URL; ComponentLink2URL: https://jlcpcb.com/partdetail/C113906; ComponentLink3Description: LCSC Part URL; ComponentLink3URL: https://lcsc.com/product-detail/Multilayer-Ceramic-Capacitors-MLCC---SMD-SMT_YAGEO-YAGEO-CC1206KRX7R9BB222_C113906.html
footprint CAP-1206 (1206 (3216M) Capacitor)
pins: 1, 2

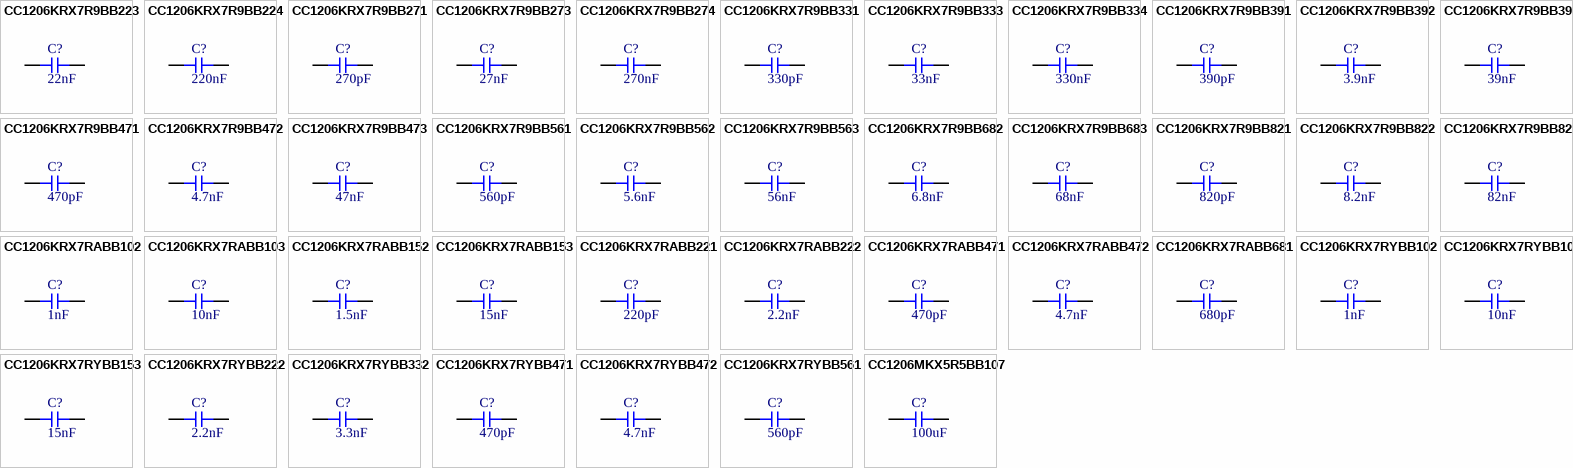
[diagram p33: symbols CC1206KRX7R9BB223 to CC1206MKX5R5BB107]

## CC1206KRX7R9BB223
designator C?  Capacitance: 22nF  (hidden comment: *)
Capacitor, Ceramic (MLCC), 22nF, ±10%, 50V, X7R, ±10%, SMD 1206; Manufacturer: YAGEO; Manufacturer Part Number: CC1206KRX7R9BB223; Package Size: 1206; JLCPCB Basic Part: No; JLCPCB Part Number: C113907; Supplier 1: LCSC; Category: Capacitors - MLCC; Supplier Part Number 1: C113907; Tolerance: ±10%; Voltage Rating: 50V; Temperature Coefficient: X7R; RoHS: Yes; ComponentLink1Description: Datasheet; ComponentLink1URL: https://wmsc.lcsc.com/wmsc/upload/file/pdf/v2/lcsc/2304140030_YAGEO-CC1206KRX7R9BB223_C113907.pdf; ComponentLink2Description: JLCPCB Part URL; ComponentLink2URL: https://jlcpcb.com/partdetail/C113907; ComponentLink3Description: LCSC Part URL; ComponentLink3URL: https://lcsc.com/product-detail/Multilayer-Ceramic-Capacitors-MLCC---SMD-SMT_YAGEO-YAGEO-CC1206KRX7R9BB223_C113907.html
footprint CAP-1206 (1206 (3216M) Capacitor)
pins: 1, 2

## CC1206KRX7R9BB224
designator C?  Capacitance: 220nF  (hidden comment: *)
Capacitor, Ceramic (MLCC), 220nF, ±10%, 50V, X7R, ±10%, SMD 1206; Manufacturer: YAGEO; Manufacturer Part Number: CC1206KRX7R9BB224; Package Size: 1206; JLCPCB Basic Part: No; JLCPCB Part Number: C577242; Supplier 1: LCSC; Category: Capacitors - MLCC; Supplier Part Number 1: C577242; Tolerance: ±10%; Voltage Rating: 50V; Temperature Coefficient: X7R; RoHS: Yes; ComponentLink1Description: Datasheet; ComponentLink1URL: https://wmsc.lcsc.com/wmsc/upload/file/pdf/v2/lcsc/2204021130_YAGEO-CC1206KRX7R9BB224_C577242.pdf; ComponentLink2Description: JLCPCB Part URL; ComponentLink2URL: https://jlcpcb.com/partdetail/C577242; ComponentLink3Description: LCSC Part URL; ComponentLink3URL: https://lcsc.com/product-detail/Multilayer-Ceramic-Capacitors-MLCC---SMD-SMT_YAGEO-YAGEO-CC1206KRX7R9BB224_C577242.html
footprint CAP-1206 (1206 (3216M) Capacitor)
pins: 1, 2

## CC1206KRX7R9BB271
designator C?  Capacitance: 270pF  (hidden comment: *)
Capacitor, Ceramic (MLCC), 270pF, ±10%, 50V, X7R, ±10%, SMD 1206; Manufacturer: YAGEO; Manufacturer Part Number: CC1206KRX7R9BB271; Package Size: 1206; JLCPCB Basic Part: No; JLCPCB Part Number: C541484; Supplier 1: LCSC; Category: Capacitors - MLCC; Supplier Part Number 1: C541484; Tolerance: ±10%; Voltage Rating: 50V; Temperature Coefficient: X7R; RoHS: Yes; ComponentLink1Description: Datasheet; ComponentLink1URL: https://wmsc.lcsc.com/wmsc/upload/file/pdf/v2/lcsc/2006151140_YAGEO-CC1206KRX7R9BB271_C541484.pdf; ComponentLink2Description: JLCPCB Part URL; ComponentLink2URL: https://jlcpcb.com/partdetail/C541484; ComponentLink3Description: LCSC Part URL; ComponentLink3URL: https://lcsc.com/product-detail/Multilayer-Ceramic-Capacitors-MLCC---SMD-SMT_YAGEO-YAGEO-CC1206KRX7R9BB271_C541484.html
footprint CAP-1206 (1206 (3216M) Capacitor)
pins: 1, 2

## CC1206KRX7R9BB273
designator C?  Capacitance: 27nF  (hidden comment: *)
Capacitor, Ceramic (MLCC), 27nF, ±10%, 50V, X7R, ±10%, SMD 1206; Manufacturer: YAGEO; Manufacturer Part Number: CC1206KRX7R9BB273; Package Size: 1206; JLCPCB Basic Part: No; JLCPCB Part Number: C527354; Supplier 1: LCSC; Category: Capacitors - MLCC; Supplier Part Number 1: C527354; Tolerance: ±10%; Voltage Rating: 50V; Temperature Coefficient: X7R; RoHS: Yes; ComponentLink1Description: Datasheet; ComponentLink1URL: https://wmsc.lcsc.com/wmsc/upload/file/pdf/v2/lcsc/2005261833_YAGEO-CC1206KRX7R9BB273_C527354.pdf; ComponentLink2Description: JLCPCB Part URL; ComponentLink2URL: https://jlcpcb.com/partdetail/C527354; ComponentLink3Description: LCSC Part URL; ComponentLink3URL: https://lcsc.com/product-detail/Multilayer-Ceramic-Capacitors-MLCC---SMD-SMT_YAGEO-YAGEO-CC1206KRX7R9BB273_C527354.html
footprint CAP-1206 (1206 (3216M) Capacitor)
pins: 1, 2

## CC1206KRX7R9BB274
designator C?  Capacitance: 270nF  (hidden comment: *)
Capacitor, Ceramic (MLCC), 270nF, ±10%, 50V, X7R, ±10%, SMD 1206; Manufacturer: YAGEO; Manufacturer Part Number: CC1206KRX7R9BB274; Package Size: 1206; JLCPCB Basic Part: No; JLCPCB Part Number: C577243; Supplier 1: LCSC; Category: Capacitors - MLCC; Supplier Part Number 1: C577243; Tolerance: ±10%; Voltage Rating: 50V; Temperature Coefficient: X7R; RoHS: Yes; ComponentLink1Description: Datasheet; ComponentLink1URL: https://wmsc.lcsc.com/wmsc/upload/file/pdf/v2/lcsc/2208251800_YAGEO-CC1206KRX7R9BB274_C577243.pdf; ComponentLink2Description: JLCPCB Part URL; ComponentLink2URL: https://jlcpcb.com/partdetail/C577243; ComponentLink3Description: LCSC Part URL; ComponentLink3URL: https://lcsc.com/product-detail/Multilayer-Ceramic-Capacitors-MLCC---SMD-SMT_YAGEO-YAGEO-CC1206KRX7R9BB274_C577243.html
footprint CAP-1206 (1206 (3216M) Capacitor)
pins: 1, 2

## CC1206KRX7R9BB331
designator C?  Capacitance: 330pF  (hidden comment: *)
Capacitor, Ceramic (MLCC), 330pF, ±10%, 50V, X7R, ±10%, SMD 1206; Manufacturer: YAGEO; Manufacturer Part Number: CC1206KRX7R9BB331; Package Size: 1206; JLCPCB Basic Part: No; JLCPCB Part Number: C541482; Supplier 1: LCSC; Category: Capacitors - MLCC; Supplier Part Number 1: C541482; Tolerance: ±10%; Voltage Rating: 50V; Temperature Coefficient: X7R; RoHS: Yes; ComponentLink1Description: Datasheet; ComponentLink1URL: https://wmsc.lcsc.com/wmsc/upload/file/pdf/v2/lcsc/2006151140_YAGEO-CC1206KRX7R9BB331_C541482.pdf; ComponentLink2Description: JLCPCB Part URL; ComponentLink2URL: https://jlcpcb.com/partdetail/C541482; ComponentLink3Description: LCSC Part URL; ComponentLink3URL: https://lcsc.com/product-detail/Multilayer-Ceramic-Capacitors-MLCC---SMD-SMT_YAGEO-YAGEO-CC1206KRX7R9BB331_C541482.html
footprint CAP-1206 (1206 (3216M) Capacitor)
pins: 1, 2
